# Altium footprint library 3.05-RJ11-RJ45-D_SUB-VGA-SCSI接口-网络变压器.PcbLib: 53 footprints (part 4 of 4)
Each footprint in its own frame and in the unit in brackets; x right, y up, seen from the top. Pads: shape width x height; smd on the part's side, far side on the other; paste and mask are expansions set on the pad; w line width, h text height; cw(c..) or ccw(c..) is an arc to the next point about the centre after c.
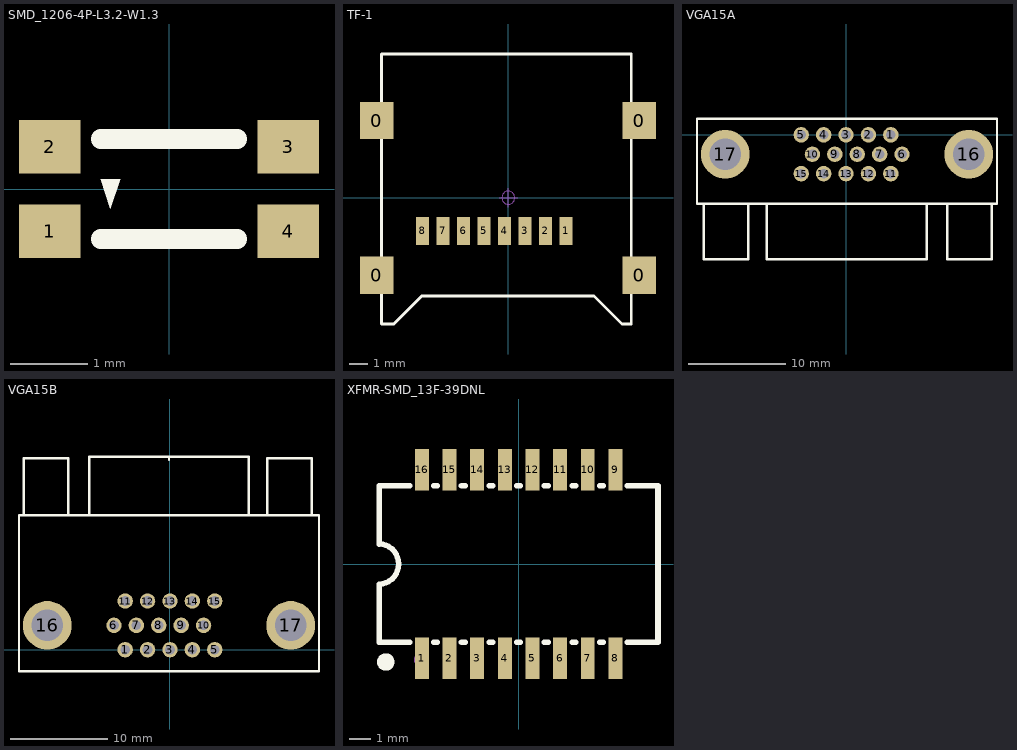
[diagram p3: the footprints below, top view; thin cyan lines are the x and y axes]

## SMD_1206-4P-L3.2-W1.3 [mm]
pads (4):
  rect 0.8x0.7 smd: 1(-1.55,-0.55) 2(-1.55,0.55) 3(1.55,0.55) 4(1.55,-0.55)
Top Overlay:
  region: -0.889,0.127 -0.635,0.127 -0.762,-0.254
  lines w0.254: -0.889,-0.65 0.889,-0.65 ; -0.889,0.65 0.889,0.65
3D body: height 0.71, standoff 0, extent -1.6,-0.8 1.6,0.8

## TF-1 [mm]
height 2
pads (12):
  rect 1.8x2 smd: 0(-7.068,-4.16) 0(-7.068,4.14) 0(7.032,-4.16) 0(7.032,4.14)
  rect 0.7x1.5 smd: 1(3.1,-1.783) 2(2,-1.783) 3(0.9,-1.783) 4(-0.2,-1.783) 5(-1.3,-1.783) 6(-2.4,-1.783) 7(-3.5,-1.783) 8(-4.6,-1.783)
Top Overlay:
  lines w0.152: -6.8,-6.783 -6.15,-6.783 -4.65,-5.283 4.6,-5.283 6.1,-6.783 6.6,-6.783 6.6,7.717 3.1,7.717 -6.8,7.717 -6.8,-6.783
Mechanical 15:
  circle w0.05: c0,0 r0.35
  lines w0.05: -0.5,0 0.5,0 ; 0,-0.5 0,0.5
3D body: height 1.93, standoff -0.02, extent -7.4,-6.783 7.2,7.717

## VGA15A [mm] "15针通讯接口"
pads (17):
  round 1.58 hole 1: 1(4.6,0) 2(2.3,0) 3(0,0) 4(-2.3,0) 5(-4.6,0) 6(5.75,-1.992) 7(3.45,-1.992) 8(1.15,-1.992) 9(-1.15,-1.992) 10(-3.45,-1.992) 11(4.6,-3.984) 12(2.3,-3.984) 13(0,-3.984) 14(-2.3,-3.984) 15(-4.6,-3.984)
  round 5 hole 3.25: 16(12.6,-1.992) 17(-12.4,-1.992)
Top Overlay:
  lines w0.254: -14.605,-7.087 -14.605,-12.751 -10.025,-12.751 -10.025,-7.087 ; -8.125,-7.061 -8.125,-12.751 8.275,-12.751 8.275,-7.137 ; 10.405,-7.061 10.405,-12.751 14.975,-12.751 14.975,-7.061 ; -15.3,-7.061 15.5,-7.061 15.5,1.629 -15.3,1.629 -15.3,-7.061
Mechanical 15:
  circle w0.05: c0,0 r0.35
  lines w0.05: -0.5,0 0.5,0 ; 0,-0.5 0,0.5
3D body: height 10.75, standoff -2.59, extent -15.397,-12.395 15.403,1.075

## VGA15B [mm] "15针通讯接口"
pads (17):
  round 1.58 hole 1: 1(-4.6,0) 2(-2.3,0) 3(0,0) 4(2.3,0) 5(4.6,0) 6(-5.75,2.5) 7(-3.45,2.5) 8(-1.15,2.5) 9(1.15,2.5) 10(3.45,2.5) 11(-4.6,5) 12(-2.3,5) 13(0,5) 14(2.3,5) 15(4.6,5)
  round 5 hole 3.25: 16(-12.6,2.5) 17(12.4,2.5)
Top Overlay:
  lines w0.254: -15.5,-2.2 -15.5,13.8 15.3,13.8 15.3,-2.2 -15.49,-2.2 -15.5,-2.19 ; -15,13.8 -15,19.67 -10.43,19.67 -10.43,13.82 ; -8.3,13.8 -8.3,19.8 8.1,19.8 8.1,13.8 ; -0.1,19.5 -0.1,19.8 ; 10,13.8 10,19.68 14.58,19.68 14.58,13.84
Mechanical 15:
  circle w0.05: c0,0 r0.35
  lines w0.05: -0.5,0 0.5,0 ; 0,-0.5 0,0.5
3D body: height 12.77, standoff -3.27, extent -15.655,-0.875 15.155,20.225

## XFMR-SMD_13F-39DNL [mm] "13F-39DNL 变压器                               淘宝ID:黄晶宝石"
pads (16):
  rect 0.64x1.91 smd: 1(-4.445,-4.335) 2(-3.175,-4.335) 3(-1.905,-4.335) 4(-0.635,-4.335) 5(0.635,-4.335) 6(1.905,-4.335) 7(3.175,-4.335) 8(4.445,-4.335) 9(4.445,4.335) 10(3.175,4.335) 11(1.905,4.335) 12(0.635,4.335) 13(-0.635,4.335) 14(-1.905,4.335) 15(-3.175,4.335) 16(-4.445,4.335)
Top Overlay:
  circle w0.4: c-6.1,-4.5 r0.2
  lines w0.254: -6.405,-0.949 -6.405,-3.595 -6.4,-3.6 -4.996,-3.6 ; -6.405,-0.932 ccw(c-6.443,0) -6.405,0.932 ; -6.405,0.915 -6.405,3.6 -4.996,3.6 ; -3.894,-3.6 -3.726,-3.6 ; -3.894,3.6 -3.726,3.6 ; -2.624,-3.6 -2.456,-3.6 ; -2.624,3.6 -2.456,3.6 ; -1.354,-3.6 -1.186,-3.6 ; -1.354,3.6 -1.186,3.6 ; -0.084,-3.6 0.084,-3.6 ; -0.084,3.6 0.084,3.6 ; 1.186,-3.6 1.354,-3.6 ; 1.186,3.6 1.354,3.6 ; 2.456,-3.6 2.624,-3.6 ; 2.456,3.6 2.624,3.6 ; 3.726,-3.6 3.894,-3.6 ; 3.726,3.6 3.894,3.6 ; 4.996,-3.6 6.4,-3.6 6.4,3.6 4.996,3.6
Mechanical 15:
  circle w0.3: c-4.5,-4.4 r0.15
3D body: height 2.15, standoff 0, extent -6.35,-4.76 6.35,4.76